# Altium footprint library PcbLib.PcbLib: 35 footprints (part 2 of 3)
Each footprint in its own frame and in the unit in brackets; x right, y up, seen from the top. Pads: shape width x height; smd on the part's side, far side on the other; paste and mask are expansions set on the pad; w line width, h text height; cw(c..) or ccw(c..) is an arc to the next point about the centre after c.
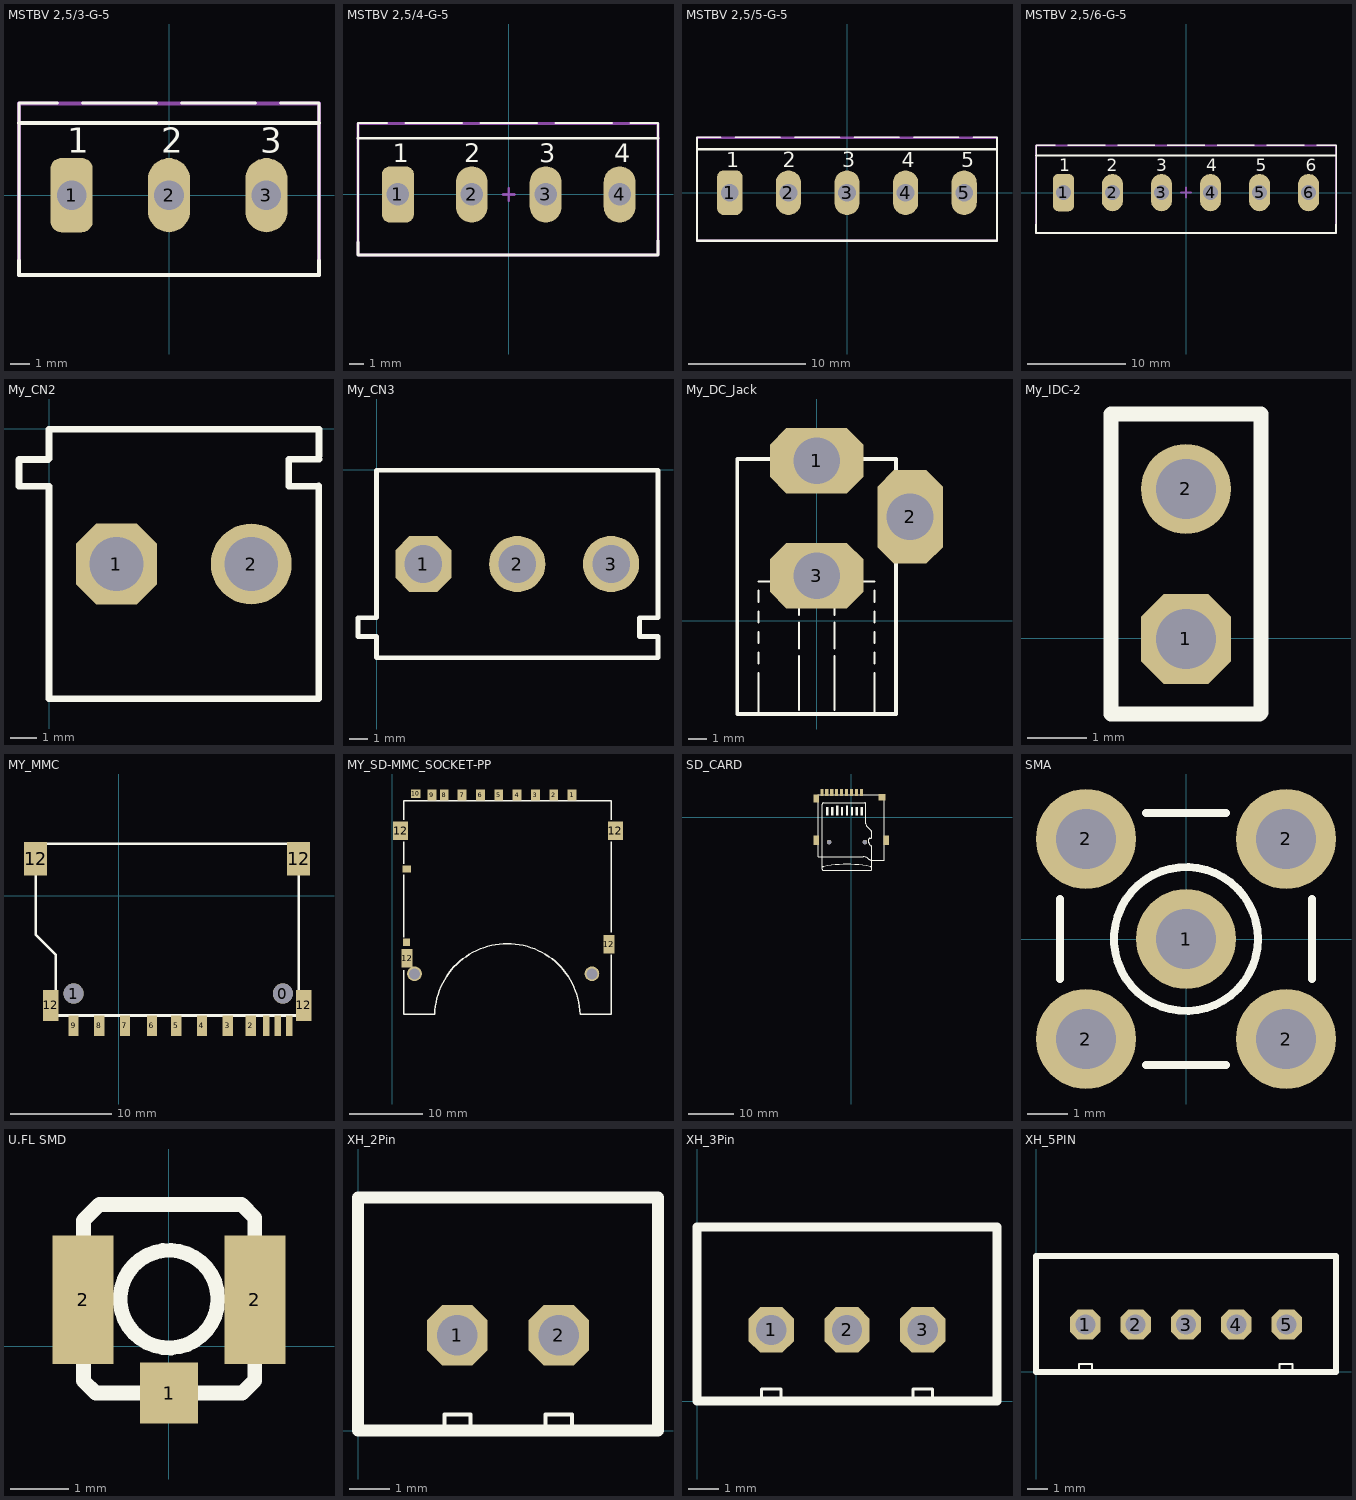
[diagram p1: the footprints below, top view; thin cyan lines are the x and y axes]

## MSTBV 2,5/3-G-5 [mil] "Header, Nominal current: 12 A Rated voltage (III/2): 320 V Number of positions: 3 Pitch: 5mm Color: green Contact surface: Tin Assembly: Soldering  DESIGNER:ABBAS BASEREH"
height 338.58
pads (3):
  rrect50% 85x150 hole 60: 1(-196.85,0)
  oval 85x150 hole 60: 2(0,0) 3(196.85,0)
Top Overlay:
  lines w6: -303.15,-131.85 -303.15,186.3 -225,186.3 ; -175,186.3 -25,186.3 ; 25,186.3 175,186.3 ; 225,186.3 303.15,186.3 303.15,-131.85
  lines w7.87: -303.15,-131.85 -303.15,-161.42 303.15,-161.42 303.15,-131.85 ; -303.15,145.67 303.15,145.67
  text "1" at -205.2,85.24 h50
  text "2" at -15.2,85.24 h50
  text "3" at 184.8,85.24 h50
Mechanical 13:
  lines w6: -303.15,-131.85 -303.15,186.3 -225,186.3 ; -175,186.3 -25,186.3 ; 25,186.3 175,186.3 ; 225,186.3 303.15,186.3 303.15,-131.85
Mechanical 15:
  lines w7.87: -303.15,-161.42 -299.21,-161.42 303.15,-161.42 303.15,185.04 -303.15,185.04 -303.15,-161.42
3D body "1753453.stEp": height 473.44, standoff -152.54, extent -295.28,-153.54 295.28,185.04

## MSTBV 2,5/4-G-5 [mil] "Header, Nominal current: 12 A Rated voltage (III/2): 320 V Number of positions: 4 Pitch: 5mm Color: green Contact surface: Tin Assembly: Soldering  DESIGNER ABBAS BASEREH"
height 338.58
pads (4):
  rrect50% 85x150 hole 60: 1(-295.28,0)
  oval 85x150 hole 60: 2(-98.43,0) 3(98.43,0) 4(295.28,0)
Top Overlay:
  lines w6: -401.57,-126.34 -401.57,190.24 -325,190.24 ; -275,190.24 -125,190.24 ; -75,190.24 75,190.24 ; 125,190.24 275,190.24 ; 325,190.24 397.64,190.24 397.64,-122.4
  lines w7.87: -401.57,-126.34 -401.57,-161.42 397.64,-161.42 397.64,-122.4 ; -401.57,149.61 397.64,149.61
  text "1" at -309.13,85.24 h50
  text "2" at -119.13,85.24 h50
  text "3" at 80.87,85.24 h50
  text "4" at 280.87,85.24 h50
Mechanical 13:
  lines w6: -401.57,-126.34 -401.57,190.24 -325,190.24 ; -275,190.24 -125,190.24 ; -75,190.24 75,190.24 ; 125,190.24 275,190.24 ; 325,190.24 397.64,190.24 397.64,-122.4
Mechanical 15:
  lines w7.87: -15.75,0 15.75,0 ; 0,-15.75 0,15.75 ; -401.57,-161.42 -401.57,188.98 397.64,188.98 397.64,-161.42 -401.57,-161.42
3D body "1753479.stEp": height 472.44, standoff -153.54, extent -393.7,-152.56 393.7,186.02

## MSTBV 2,5/5-G-5 [mil] "Header, Nominal current: 12 A Rated voltage (III/2): 320 V Number of positions: 5 Pitch: 5mm Color: green Contact surface: Tin Assembly: Soldering  DESIGNER ABBAS BASEREH"
height 338.58
pads (5):
  rrect50% 85x150 hole 60: 1(-393.7,0)
  oval 85x150 hole 60: 2(-196.85,0) 3(0,0) 4(196.85,0) 5(393.7,0)
Top Overlay:
  lines w6: -503.94,-132.64 -503.94,186.3 -425,186.3 ; -375,186.3 -225,186.3 ; -175,186.3 -25,186.3 ; 25,186.3 175,186.3 ; 225,186.3 375,186.3 ; 425,186.3 503.94,186.3 503.94,-132.64
  lines w7.87: -503.94,-132.64 -503.94,-161.42 503.94,-161.42 503.94,-132.64 ; -503.94,145.67 503.94,145.67
  text "5" at 383.94,86.22 h50
  text "4" at 183.94,86.22 h50
  text "3" at -16.06,86.22 h50
  text "2" at -216.06,86.22 h50
  text "1" at -406.06,86.22 h50
Mechanical 13:
  lines w6: -503.94,-132.64 -503.94,186.3 -425,186.3 ; -375,186.3 -225,186.3 ; -175,186.3 -25,186.3 ; 25,186.3 175,186.3 ; 225,186.3 375,186.3 ; 425,186.3 503.94,186.3 503.94,-132.64
Mechanical 15:
  lines w7.87: -503.94,-161.42 503.94,-161.42 503.94,185.04 -503.94,185.04 -503.94,-161.42
3D body "1753495.stEp": height 472.44, standoff -153.54, extent -492.13,-153.54 492.13,185.04

## MSTBV 2,5/6-G-5 [mil] "Header, Nominal current: 12 A Rated voltage (III/2): 320 V Number of positions: 6 Pitch: 5mm Color: green Contact surface: Tin Assembly: Soldering  DESIGNER ABBAS BASEREH"
height 338.58
pads (6):
  rrect50% 85x150 hole 60: 1(-492.13,0)
  oval 85x150 hole 60: 2(-295.28,0) 3(-98.43,0) 4(98.43,0) 5(295.28,0) 6(492.13,0)
Top Overlay:
  lines w6: -602.36,-127.13 -602.36,190.24 -525,190.24 ; -475,190.24 -325,190.24 ; -275,190.24 -125,190.24 ; -75,190.24 75,190.24 ; 125,190.24 275,190.24 ; 325,190.24 475,190.24 ; 525,190.24 602.36,190.24 602.36,-127.13
  lines w7.87: -602.36,-127.13 -602.36,-161.42 602.36,-161.42 602.36,-127.13 ; -602.36,149.61 602.36,149.61
  text "1" at -509.13,85.24 h50
  text "2" at -319.13,85.24 h50
  text "3" at -119.13,85.24 h50
  text "4" at 80.87,85.24 h50
  text "5" at 280.87,85.24 h50
  text "6" at 480.87,85.24 h50
Mechanical 13:
  lines w6: -602.36,-127.13 -602.36,190.24 -525,190.24 ; -475,190.24 -325,190.24 ; -275,190.24 -125,190.24 ; -75,190.24 75,190.24 ; 125,190.24 275,190.24 ; 325,190.24 475,190.24 ; 525,190.24 602.36,190.24 602.36,-127.13
Mechanical 15:
  lines w7.87: -19.68,0 19.68,0 ; 0,-19.68 0,19.68 ; -602.36,-161.42 -602.36,188.98 602.36,188.98 602.36,-161.42 -602.36,-161.42
3D body "1753518.stEp": height 472.44, standoff -153.54, extent -590.55,-153.54 590.55,185.04

## My_CN2 [mil]
pads (2):
  oct 120x120 hole 80: 1(99.5,-200.5)
  round 120 hole 80: 2(299.5,-200.5)
Top Overlay:
  lines w10: -45,-85 -45,-45.63 -1.63,-45.63 ; -44.37,-85 -0.5,-85 -0.5,-400.5 399.5,-400.5 399.5,-84.5 ; -0.5,-44.5 -0.5,-34.5 -0.5,-0.5 399.5,-0.5 ; 399,-85 355,-85 355,-45 400,-45 ; 400,-40 400,-0.63

## My_CN3 [mil]
pads (3):
  oct 120x120 hole 80: 1(99.5,-200.5)
  round 120 hole 80: 2(299.5,-200.5) 3(499.5,-200.5)
Top Overlay:
  lines w10: -40,-315.63 -40,-355 -0.63,-355 ; -40,-315 -0.63,-315 -0.63,-0.63 ; -0.5,-355.13 -0.5,-400.5 599.5,-400.5 599.5,-355.13 ; -0.5,-0.5 599.5,-0.5 ; 560,-315.63 560,-355 599.37,-355 ; 560,-315 599.37,-315 599.37,-0.63

## My_DC_Jack [mm]
pads (3):
  oct 5x3.5 hole 2.5: 1(0,8.57) 3(0,2.42)
  oct 3.5x5 hole 2.5: 2(5,5.57)
Top Overlay:
  lines w0.102: -3.1,-4.878 -3.1,-2.78 ; -3.1,-2.28 -3.1,-1.68 ; -3.1,-1.18 -3.1,-0.58 ; -3.1,-0.08 -3.1,0.52 ; -3.1,1.02 -3.1,1.62 ; -3.1,2.12 -2.5,2.12 ; -2,2.12 -1.4,2.12 ; -0.95,-4.778 -0.95,-1.88 ; -0.95,-1.48 -0.95,-0.08 ; -0.95,0.32 -0.95,1.72 ; -0.9,2.12 -0.3,2.12 ; 0.4,2.12 1,2.12 ; 0.95,-4.778 0.95,-1.88 ; 0.95,-1.48 0.95,-0.08 ; 0.95,0.32 0.95,1.72 ; 1.4,2.12 2,2.12 ; 2.5,2.12 3.1,2.12 ; 3.1,-4.878 3.1,-2.78 ; 3.1,-2.28 3.1,-1.68 ; 3.1,-1.18 3.1,-0.58 ; 3.1,-0.08 3.1,0.52 ; 3.1,1.02 3.1,1.62
  lines w0.203: -4.25,-4.978 -4.25,8.67 4.25,8.67 4.25,-4.978 -4.25,-4.978
Mechanical 1:
  lines w0.254: -1.6,8.07 -1.6,9.07 1.6,9.07 1.6,8.07 ; -1.6,1.92 -1.6,2.92 1.6,2.92 1.6,1.92 -1.6,1.92 ; 4.5,3.97 4.5,7.17 5.5,7.17 5.5,3.97 4.5,3.97

## My_IDC-2 [mil]
pads (2):
  oct 60x60 hole 40: 1(259.5,-0.5)
  round 60 hole 40: 2(259.5,99.5)
Top Overlay:
  lines w10: 209.5,-50.5 209.5,149.5 309.5,149.5 309.5,49.5 309.5,-49.5 308.5,-50.5 209.5,-50.5

## MY_MMC [mil]
height 78.74
pads (17):
  round 78.74 hole 78.74: 0(640,-380) 1(-175,-380)
  rect 25x80 smd: 1(575,-505) 10(620,-505) 11(665,-505)
  rect 40x80 smd: 2(515,-505) 3(425,-505) 4(325,-505) 5(225,-505) 6(130,-505) 7(25,-505) 8(-75,-505) 9(-175,-505)
  rect 90x130 smd: 12(-322.64,144.61) 12(700.98,144.61)
  rect 60x120 smd: 12(-263.58,-426.26) 12(720.67,-426.26)
Top Overlay:
  lines w10: -322.64,-150.67 -322.64,203.66 700.98,203.66 700.98,-465.63 -243.9,-465.63 -243.9,-229.41 -322.64,-150.67

## MY_SD-MMC_SOCKET-PP [mm]
height 2
pads (18):
  rect 1.2x1.5 smd: 1(24.493,-6.853) 2(21.993,-6.853) 3(19.493,-6.853) 4(16.993,-6.853) 5(14.493,-6.853) 6(11.993,-6.853) 7(9.493,-6.853) 8(7.073,-6.853) 9(5.385,-6.833)
  rect 1.3x1.1 smd: 10(3.175,-6.655)
  rect 1.15x1 smd: 11(1.933,-16.903)
  rect 2x2.5 smd: 12(1.113,-11.703) 12(30.413,-11.703)
  rect 1x1.05 smd: 12(1.933,-26.903)
  rect 1.5x2.5 smd: 12(2.013,-29.103) 12(29.515,-27.178)
  round 2 hole 1.5 unplated: ""(3.013,-31.203) ""(27.213,-31.203)
Top Overlay:
  lines w0.203: 1.513,-30.703 1.513,-36.703 5.773,-36.703 cw(c15.683,-37) 25.593,-36.703 29.863,-36.703 29.863,-28.575 ; 1.513,-26.203 1.513,-17.703 ; 1.513,-16.203 1.513,-13.203 ; 1.513,-10.203 1.513,-7.603 29.863,-7.603 29.863,-10.203 ; 29.863,-25.527 29.863,-13.203

## SD_CARD [mm] "T-FLASH PUSH-PUSH"
height 2
pads (15):
  round 1 hole 1 unplated: 0(-4.95,-5.5) 0(3.05,-5.5)
  rect 0.7x1.6 smd: 1(2.25,5.5) 2(1.15,5.5) 3(0.05,5.5) 4(-1.05,5.5) 5(-2.15,5.5) 6(-3.25,5.5) 7(-4.35,5.5) 8(-5.45,5.5) 9(-6.55,5.5)
  rect 1.2x1.8 smd: 10(-7.75,4.2)
  rect 1.2x2.2 smd: 11(-7.75,-5.1) 12(7.75,-5.1)
  rect 1.6x1.5 smd: 13(6.85,4.45)
Top Overlay:
  rectangle: -5.604,0.4 -5.096,2.254
  rectangle: -4.504,0.4 -3.996,2.254
  rectangle: -3.404,0.4 -2.896,2.635
  rectangle: -2.304,0.4 -1.796,2.254
  rectangle: -1.204,0.4 -0.696,2.635
  rectangle: -0.104,0.4 0.404,2.254
  rectangle: 0.996,0.4 1.504,2.254
  rectangle: 2.096,0.4 2.604,2.254
  lines w0.2: -6.437,-11.153 cw(c-6.027,-11.564) -6.148,-10.996 cw(c-0.95,-35.45) 4.248,-10.996 cw(c4.127,-11.564) 4.537,-11.153 ; 3.85,-5.622 3.85,-4.904 cw(c4.104,-4.904) 4.104,-4.65 4.296,-4.65 ccw(c4.296,-4.396) 4.55,-4.396 4.55,-3.36 ccw(c4.042,-3.36) 4.401,-3.001 3.55,-2.15 cw(c4.274,-1.426) 3.25,-1.426 3.25,2.946 ccw(c2.996,2.946) 2.996,3.2 -6.196,3.2 ccw(c-6.196,2.946) -6.45,2.946 -6.45,-11.546 ccw(c-6.196,-11.546) -6.196,-11.8 4.296,-11.8 ccw(c4.296,-11.546) 4.55,-11.546 4.55,-6.71 ; 3.85,-5.59 ccw(c4.358,-5.59) 3.999,-5.949 4.401,-6.351 cw(c4.042,-6.71) 4.55,-6.71
  lines w0.254: -7.375,-8.8 -7.375,5 7.375,5 7.375,-9.5 4.375,-9.5 cw(c4.375,-8.884) 3.94,-9.32 ccw(c2.685,-10.574) 2.685,-8.8 -7.375,-8.8
3D body "SW3dPS-Micro_SD.STEP": height 1.7, standoff 0.72, extent -6.389,-11.811 4.611,3.189
3D body "User Library-MEM2055-00-190-01-A_revG.STEP": height 1.85, standoff -0.6, extent -8.001,-9.53 7.999,5.72

## SMA [mm]
pads (5):
  round 2.5 hole 1.5: 1(0,0) 2(-2.5,-2.5) 2(-2.5,2.5) 2(2.5,-2.5) 2(2.5,2.5)
Top Overlay:
  circle w0.2: c0,0 r1.8
  lines w0.2: -3.15,-1 -3.15,1 ; -1,-3.15 1,-3.15 ; -1,3.15 1,3.15 ; 3.15,-1 3.15,1
Mechanical 1:
  circle w0.025: c0,0 r0.2
  circle w0.025: c0,0 r1.05
  circle w0.025: c0,0 r1.8
3D body "User Library-LNB.STEP": height 10.2, standoff -3.5, extent -3.25,-3.25 3.25,3.25

## U.FL SMD [mm] "U.FL Antenna-Design:Ali Hafizi"
pads (3):
  rect 1x1.05 smd: 1(0.002,-0.8)
  rect 1.05x2.2 smd: 2(-1.475,0.8) 2(1.475,0.8)
Top Overlay:
  circle w0.254: c0,0.813 r0.838
  lines w0.254: -1.47,-0.588 -1.257,-0.8 1.257,-0.8 1.473,-0.584 1.473,2.21 1.245,2.438 -1.194,2.438 -1.47,2.163 -1.47,-0.588
3D body "SW3dPS-UFL-R-SMD.STEP": height 1.25, standoff 0, extent -1.726,-0.763 1.674,2.337

## XH_2Pin [mm]
pads (2):
  oct 1.5x1.5 hole 1: 1(2.45,2.35) 2(4.95,2.35)
Top Overlay:
  lines w0.1: 2.13,0 2.13,0.4 2.77,0.4 ; 2.775,0 2.775,0.4 ; 4.63,0 4.63,0.4 5.275,0.4 5.275,0
  lines w0.3: 0,0 7.4,0 7.4,5.75 0,5.75 0,0

## XH_3Pin [mm]
pads (3):
  oct 1.5x1.5 hole 1: 1(2.45,2.35) 2(4.95,2.35) 3(7.45,2.35)
Top Overlay:
  lines w0.1: 2.125,0 2.125,0.4 ; 2.13,0.4 2.77,0.4 2.77,0 ; 7.125,0 7.125,0.4 ; 7.13,0.4 7.77,0.4 7.77,0
  lines w0.3: 9.8,0 0,0 0,5.75 9.8,5.75 ; 9.9,0 9.9,5.75

## XH_5PIN [mm]
pads (5):
  oct 1.5x1.5 hole 1: 1(2.45,2.35) 2(4.95,2.35) 3(7.45,2.35) 4(9.95,2.35) 5(12.45,2.35)
Top Overlay:
  lines w0.1: 2.13,0 2.13,0.4 2.77,0.4 2.77,0 ; 12.1,0 12.1,0.4 12.74,0.4 12.74,0
  lines w0.3: 14.8,0 0,0 0,5.75 14.8,5.75 ; 14.9,0 14.9,5.75